# Altium footprint library 6-Connectors-4.PcbLib: 166 footprints (part 8 of 12)
Each footprint in its own frame and in the unit in brackets; x right, y up, seen from the top. Pads: shape width x height; smd on the part's side, far side on the other; paste and mask are expansions set on the pad; w line width, h text height; cw(c..) or ccw(c..) is an arc to the next point about the centre after c.
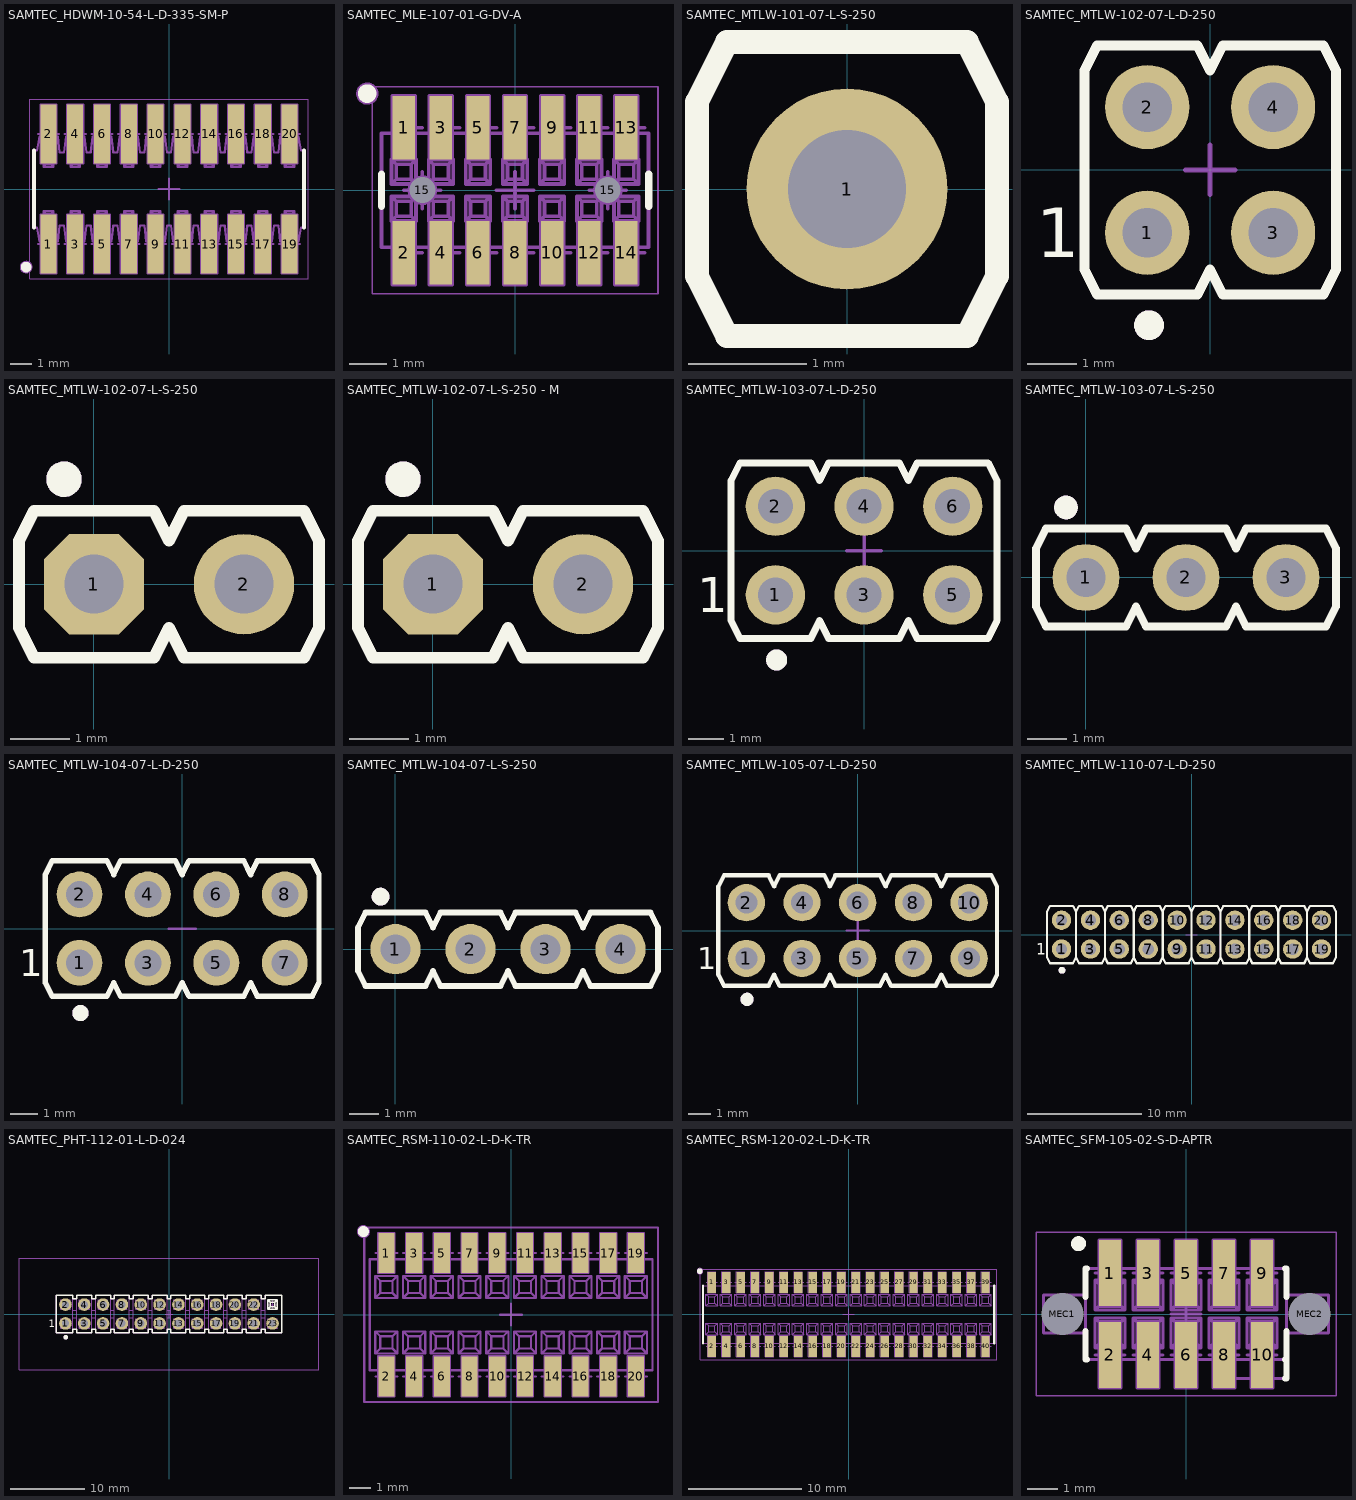
[diagram p7: the footprints below, top view; thin cyan lines are the x and y axes]

## SAMTEC_HDWM-10-54-L-D-335-SM-P [mm] "20 Contacts - Pitch 1.27mm - Dual Row Straight SMD Micro Board Stacker"
height 11.05
pads (20):
  rect 0.76x2.79 smd: 1(-5.715,-2.615) 2(-5.715,2.615) 3(-4.445,-2.615) 4(-4.445,2.615) 5(-3.175,-2.615) 6(-3.175,2.615) 7(-1.905,-2.615) 8(-1.905,2.615) 9(-0.635,-2.615) 10(-0.635,2.615) 11(0.635,-2.615) 12(0.635,2.615) 13(1.905,-2.615) 14(1.905,2.615) 15(3.175,-2.615) 16(3.175,2.615) 17(4.445,-2.615) 18(4.445,2.615) 19(5.715,-2.615) 20(5.715,2.615)
Top Overlay:
  circle w0.25: c-6.775,-3.7 r0.125
  circle w0.25: c-6.775,-3.7 r0.125
  lines w0.2: -6.395,-1.829 -6.395,1.829 ; 6.395,-1.829 6.395,1.829
Mechanical 8:
  drawing of 164 lines, arcs and shapes, not listed
Mechanical 14:
  drawing of 343 lines, arcs and shapes, not listed
Mechanical 15:
  lines w0.05: -6.6,-4.26 -6.6,4.26 6.6,4.26 6.6,-4.26 -6.6,-4.26
3D body "p279-076.stp": height 0.02, standoff 0, extent 5.335,1.22 6.095,4.01
3D body "p279-076.stp": height 0.02, standoff 0, extent 5.335,-4.01 6.095,-1.22
3D body "p279-076.stp": height 0.02, standoff 0, extent 4.065,1.22 4.825,4.01
3D body "p279-076.stp": height 0.02, standoff 0, extent 4.065,-4.01 4.825,-1.22
3D body "p279-076.stp": height 0.02, standoff 0, extent 2.795,1.22 3.555,4.01
3D body "p279-076.stp": height 0.02, standoff 0, extent 2.795,-4.01 3.555,-1.22
3D body "p279-076.stp": height 0.02, standoff 0, extent 1.525,-4.01 2.285,-1.22
3D body "p279-076.stp": height 0.02, standoff 0, extent 1.525,1.22 2.285,4.01
3D body "p279-076.stp": height 0.02, standoff 0, extent 0.255,1.22 1.015,4.01
3D body "p279-076.stp": height 0.02, standoff 0, extent 0.255,-4.01 1.015,-1.22
3D body "p279-076.stp": height 0.02, standoff 0, extent -1.015,-4.01 -0.255,-1.22
3D body "p279-076.stp": height 0.02, standoff 0, extent -1.015,1.22 -0.255,4.01
3D body "p279-076.stp": height 0.02, standoff 0, extent -2.285,1.22 -1.525,4.01
3D body "p279-076.stp": height 0.02, standoff 0, extent -2.285,-4.01 -1.525,-1.22
3D body "p279-076.stp": height 0.02, standoff 0, extent -3.555,-4.01 -2.795,-1.22
3D body "p279-076.stp": height 0.02, standoff 0, extent -3.555,1.22 -2.795,4.01
3D body "p279-076.stp": height 0.02, standoff 0, extent -4.825,1.22 -4.065,4.01
3D body "p279-076.stp": height 0.02, standoff 0, extent -4.825,-4.01 -4.065,-1.22
3D body "p279-076.stp": height 0.02, standoff 0, extent -6.095,-4.01 -5.335,-1.22
3D body "p279-076.stp": height 0.02, standoff 0, extent -6.095,1.22 -5.335,4.01
3D body "SAMTEC_HDWM-10-54-L-D-335-SM-P.stp": height 11.05, standoff 0, extent -6.35,-3.759 6.35,3.759

## SAMTEC_MLE-107-01-G-DV-A [mm] "12 Contacts - Pitch 1mm - Top Entry, Dual Row Surface Mount Receptacle"
height 3.5
pads (16):
  rect 0.61x1.709 smd: 1(-3,1.686) 2(-3,-1.686) 3(-2,1.686) 4(-2,-1.686) 5(-1,1.686) 6(-1,-1.686) 7(0,1.686) 8(0,-1.686) 9(1,1.686) 10(1,-1.686) 11(2,1.686) 12(2,-1.686) 13(3,1.686) 14(3,-1.686)
  round 0.5 hole 0.7 unplated mask+0.1: 15(-2.5,0) 15(2.5,0)
Top Overlay:
  circle w0.25: c-3.987,2.606 r0.125
  circle w0.25: c-3.987,2.606 r0.125
  lines w0.2: -3.6,-0.431 -3.6,0.431 ; 3.6,-0.431 3.6,0.431
Mechanical 8:
  circle w0.1: c2.5,0 r0.35
  circle w0.1: c-2.5,0 r0.35
  lines w0.1: -3,-1.186 -3,-1.686 -2.5,-1.686 ; -3,0 -2.5,0 ; -3,2.186 -3,1.686 -2.5,1.686 ; -2.5,-0.5 -2.5,0 ; -2.5,0.5 -2.5,0 ; -2,-1.186 -2,-1.686 -1.5,-1.686 ; -2,0 -2.5,0 ; -2,2.186 -2,1.686 -1.5,1.686 ; -1,-1.186 -1,-1.686 -0.5,-1.686 ; -1,2.186 -1,1.686 -0.5,1.686 ; -0.5,0 0,0 ; 0,-1.186 0,-1.686 0.5,-1.686 ; 0,-0.5 0,0 ; 0,0.5 0,0 ; 0,2.186 0,1.686 0.5,1.686 ; 0.5,0 0,0 ; 1,-1.186 1,-1.686 1.5,-1.686 ; 1,2.186 1,1.686 1.5,1.686 ; 2,-1.186 2,-1.686 2.5,-1.686 ; 2,0 2.5,0 ; 2,2.186 2,1.686 2.5,1.686 ; 2.5,-0.5 2.5,0 ; 2.5,0.5 2.5,0 ; 3,-1.186 3,-1.686 3.5,-1.686 ; 3,0 2.5,0 ; 3,2.186 3,1.686 3.5,1.686 ; -3.305,-2.54 -2.695,-2.54 -2.695,-0.831 -3.305,-0.831 -3.305,-2.54 ; -3.305,0.831 -2.695,0.831 -2.695,2.54 -3.305,2.54 -3.305,0.831 ; -2.305,-2.54 -1.695,-2.54 -1.695,-0.831 -2.305,-0.831 -2.305,-2.54 ; -2.305,0.831 -1.695,0.831 -1.695,2.54 -2.305,2.54 -2.305,0.831 ; -1.305,-2.54 -0.695,-2.54 -0.695,-0.831 -1.305,-0.831 -1.305,-2.54 ; -1.305,0.831 -0.695,0.831 -0.695,2.54 -1.305,2.54 -1.305,0.831 ; -0.305,-2.54 0.305,-2.54 0.305,-0.831 -0.305,-0.831 -0.305,-2.54 ; -0.305,0.831 0.305,0.831 0.305,2.54 -0.305,2.54 -0.305,0.831 ; 0.695,-2.54 1.305,-2.54 1.305,-0.831 0.695,-0.831 0.695,-2.54 ; 0.695,0.831 1.305,0.831 1.305,2.54 0.695,2.54 0.695,0.831 ; 1.695,-2.54 2.305,-2.54 2.305,-0.831 1.695,-0.831 1.695,-2.54 ; 1.695,0.831 2.305,0.831 2.305,2.54 1.695,2.54 1.695,0.831 ; 2.695,-2.54 3.305,-2.54 3.305,-0.831 2.695,-0.831 2.695,-2.54 ; 2.695,0.831 3.305,0.831 3.305,2.54 2.695,2.54 2.695,0.831
Mechanical 14:
  drawing of 215 lines, arcs and shapes, not listed
Mechanical 15:
  lines w0.05: -3.85,-2.79 3.85,-2.79 3.85,2.79 -3.85,2.79 -3.85,-2.79
3D body "p171-061.stp": height 0.02, standoff 0, extent 2.695,-2.54 3.305,-0.83
3D body "p171-061.stp": height 0.02, standoff 0, extent 2.695,0.831 3.305,2.541
3D body "p171-061.stp": height 0.02, standoff 0, extent 1.695,-2.54 2.305,-0.83
3D body "p171-061.stp": height 0.02, standoff 0, extent 1.695,0.831 2.305,2.541
3D body "p171-061.stp": height 0.02, standoff 0, extent 0.695,-2.54 1.305,-0.83
3D body "p171-061.stp": height 0.02, standoff 0, extent 0.695,0.831 1.305,2.541
3D body "p171-061.stp": height 0.02, standoff 0, extent -0.305,-2.54 0.305,-0.83
3D body "p171-061.stp": height 0.02, standoff 0, extent -0.305,0.831 0.305,2.541
3D body "p171-061.stp": height 0.02, standoff 0, extent -1.305,-2.54 -0.695,-0.83
3D body "p171-061.stp": height 0.02, standoff 0, extent -1.305,0.831 -0.695,2.541
3D body "p171-061.stp": height 0.02, standoff 0, extent -2.305,-2.54 -1.695,-0.83
3D body "p171-061.stp": height 0.02, standoff 0, extent -2.305,0.831 -1.695,2.541
3D body "p171-061.stp": height 0.02, standoff 0, extent -3.305,-2.54 -2.695,-0.83
3D body "p171-061.stp": height 0.02, standoff 0, extent -3.305,0.831 -2.695,2.541
3D body "SAMTEC_MLE-107-01-G-DV-A.stp": height 3.3, standoff -0.71, extent -3.6,-2.159 3.6,2.159

## SAMTEC_MTLW-101-07-L-S-250 [mm] "1 Contacts - Pitch 2.54mm - Single Row Through Mount Straight Header (Post Lead = 6.35mm, Tail Lead 3.05mm, Insulator 1.52mm)"
height 7.87
pads (1):
  round 1.7 hole 1: 1(0,0)
Top Overlay:
  lines w0.2: -1.27,-0.737 -1.016,-1.245 1.016,-1.245 1.27,-0.737 1.27,0.737 1.016,1.245 -1.016,1.245 -1.27,0.737 -1.27,-0.737
Mechanical 8:
  lines w0.1: -0.5,0 0,0 ; 0,-0.5 0,0 ; 0,0.5 0,0 ; 0.5,0 0,0
Mechanical 14:
  lines w0.1: -1.27,-0.737 -1.016,-1.245 1.016,-1.245 1.27,-0.737 1.27,0.737 1.016,1.245 -1.016,1.245 -1.27,0.737 -1.27,-0.737 ; -0.318,-0.318 0.318,-0.318 0.318,0.318 -0.318,0.318 -0.318,-0.318
3D body "SAMTEC_MTLW-101-07-L-S-250.stp": height 7.87, standoff -3.05, extent -1.27,-1.245 1.27,1.245

## SAMTEC_MTLW-102-07-L-D-250 [mm] "4 Contacts - Pitch 2.54mm - Dual Row Through Mount Straight Header (Post Lead = 6.35mm, Tail Lead 3.05mm, Insulator 1.52mm)"
height 7.87
pads (4):
  round 1.7 hole 1: 1(-1.27,-1.27) 2(-1.27,1.27) 3(1.27,-1.27) 4(1.27,1.27)
Top Overlay:
  circle w0.3: c-1.235,-3.135 r0.15
  lines w0.2: 2.54,-2.007 2.54,2.007 ; 2.54,-2.007 2.54,2.007 ; 2.54,-2.007 2.286,-2.515 0.254,-2.515 0,-2.007 -0.254,-2.515 -2.286,-2.515 -2.54,-2.007 -2.54,2.007 -2.286,2.515 -0.254,2.515 0,2.007 0.254,2.515 2.286,2.515 2.54,2.007
  text "1" at -3.517,-1.768 h1
Mechanical 8:
  lines w0.1: -1.77,-1.27 -1.27,-1.27 ; -1.77,1.27 -1.27,1.27 ; -1.27,-1.77 -1.27,-1.27 ; -1.27,-0.77 -1.27,-1.27 ; -1.27,0.77 -1.27,1.27 ; -1.27,1.77 -1.27,1.27 ; -0.77,-1.27 -1.27,-1.27 ; -0.77,1.27 -1.27,1.27 ; -0.5,0 0,0 ; 0,-0.5 0,0 ; 0,0.5 0,0 ; 0.5,0 0,0 ; 0.77,-1.27 1.27,-1.27 ; 0.77,1.27 1.27,1.27 ; 1.27,-1.77 1.27,-1.27 ; 1.27,-0.77 1.27,-1.27 ; 1.27,0.77 1.27,1.27 ; 1.27,1.77 1.27,1.27 ; 1.77,-1.27 1.27,-1.27 ; 1.77,1.27 1.27,1.27
Mechanical 14:
  circle w0.3: c-1.235,-3.135 r0.15
  lines w0.1: 2.54,-2.007 2.54,2.007 ; 2.54,-2.007 2.54,2.007 ; 2.54,-2.007 2.286,-2.515 0.254,-2.515 0,-2.007 -0.254,-2.515 -2.286,-2.515 -2.54,-2.007 -2.54,2.007 -2.286,2.515 -0.254,2.515 0,2.007 0.254,2.515 2.286,2.515 2.54,2.007 ; -1.587,-1.587 -0.953,-1.587 -0.953,-0.953 -1.587,-0.953 -1.587,-1.587 ; -1.587,0.953 -0.953,0.953 -0.953,1.587 -1.587,1.587 -1.587,0.953 ; 0.953,-1.587 1.587,-1.587 1.587,-0.953 0.953,-0.953 0.953,-1.587 ; 0.953,0.953 1.587,0.953 1.587,1.587 0.953,1.587 0.953,0.953
  text "1" at -3.517,-1.768 h1
3D body "SAMTEC_MTLW-102-07-L-D-250.stp": height 7.87, standoff -3.05, extent -2.54,-2.515 2.54,2.515

## SAMTEC_MTLW-102-07-L-S-250 [mm] "2 Contacts - Pitch 2.54mm - Single Row Through Mount Straight Header (Post Lead = 6.35mm, Tail Lead 3.05mm, Insulator 1.52mm)"
height 7.87
pads (2):
  oct 1.7x1.7 hole 1: 1(0,0)
  round 1.7 hole 1: 2(2.54,0)
Top Overlay:
  circle w0.3: c-0.508,1.778 r0.15
  lines w0.2: -1.27,-0.737 -1.27,0.737 -1.016,1.245 1.016,1.245 1.27,0.737 1.524,1.245 3.556,1.245 3.81,0.737 3.81,-0.737 3.556,-1.245 1.524,-1.245 1.27,-0.737 1.016,-1.245 -1.016,-1.245 -1.27,-0.737
Mechanical 8:
  lines w0.1: -0.5,0 0,0 ; 0,-0.5 0,0 ; 0,0.5 0,0 ; 0.5,0 0,0 ; 2.04,0 2.54,0 ; 2.54,-0.5 2.54,0 ; 2.54,0.5 2.54,0 ; 3.04,0 2.54,0
Mechanical 14:
  circle w0.3: c-0.508,1.778 r0.15
  lines w0.1: -1.27,-0.737 -1.27,0.737 -1.016,1.245 1.016,1.245 1.27,0.737 1.524,1.245 3.556,1.245 3.81,0.737 3.81,-0.737 3.556,-1.245 1.524,-1.245 1.27,-0.737 1.016,-1.245 -1.016,-1.245 -1.27,-0.737 ; -0.317,-0.318 -0.317,0.318 0.318,0.318 0.318,-0.318 -0.317,-0.318 ; 2.223,-0.318 2.223,0.318 2.858,0.318 2.858,-0.318 2.223,-0.318
3D body "m20-254via.stp": height 0.1, standoff -1.82, extent 1.69,-0.85 3.39,0.85
3D body "m20-254via.stp": height 0.1, standoff -1.82, extent -0.85,-0.85 0.85,0.85
3D body "SAMTEC_MTLW-102-07-L-S-250.stp": height 7.87, standoff -3.05, extent -1.27,-1.244 3.81,1.245

## SAMTEC_MTLW-102-07-L-S-250 - M [mm] "2 Contacts - Pitch 2.54mm - Single Row Through Mount Straight Header (Post Lead = 6.35mm, Tail Lead 3.05mm, Insulator 1.52mm)"
height 7.87
pads (2):
  oct 1.7x1.7 hole 1: 1(0,0)
  round 1.7 hole 1: 2(2.54,0)
Top Overlay:
  circle w0.3: c-0.508,1.778 r0.15
  lines w0.2: -1.27,-0.737 -1.016,-1.245 1.016,-1.245 1.27,-0.737 1.524,-1.245 3.556,-1.245 3.81,-0.737 3.81,0.737 3.556,1.245 1.524,1.245 1.27,0.737 1.016,1.245 -1.016,1.245 -1.27,0.737 -1.27,-0.737
Mechanical 8:
  lines w0.1: -0.5,0 0,0 ; 0,-0.5 0,0 ; 0,0.5 0,0 ; 0.5,0 0,0 ; 2.04,0 2.54,0 ; 2.54,-0.5 2.54,0 ; 2.54,0.5 2.54,0 ; 3.04,0 2.54,0
Mechanical 14:
  circle w0.3: c-0.508,1.778 r0.15
  lines w0.1: -1.27,-0.737 -1.016,-1.245 1.016,-1.245 1.27,-0.737 1.524,-1.245 3.556,-1.245 3.81,-0.737 3.81,0.737 3.556,1.245 1.524,1.245 1.27,0.737 1.016,1.245 -1.016,1.245 -1.27,0.737 -1.27,-0.737 ; -0.317,-0.318 0.318,-0.318 0.318,0.318 -0.317,0.318 -0.317,-0.318 ; 2.223,-0.318 2.858,-0.318 2.858,0.318 2.223,0.318 2.223,-0.318
3D body "254-jp.stp": height 7, standoff 1, extent -1.22,-1.225 3.76,1.225
3D body "SAMTEC_MTLW-102-07-L-S-250.stp": height 6.87, standoff -4.05, extent -1.27,-1.244 3.81,1.245
3D body "m20-254via.stp": height 0.1, standoff -1.82, extent -0.85,-0.85 0.85,0.85
3D body "m20-254via.stp": height 0.1, standoff -1.82, extent 1.69,-0.85 3.39,0.85

## SAMTEC_MTLW-103-07-L-D-250 [mm] "6 Contacts - Pitch 2.54mm - Dual Row Through Mount Straight Header (Post Lead = 6.35mm, Tail Lead 3.05mm, Insulator 1.52mm)"
height 7.87
pads (6):
  round 1.7 hole 1: 1(-2.54,-1.27) 2(-2.54,1.27) 3(0,-1.27) 4(0,1.27) 5(2.54,-1.27) 6(2.54,1.27)
Top Overlay:
  circle w0.3: c-2.505,-3.135 r0.15
  lines w0.2: 3.81,-2.007 3.81,2.007 ; 3.81,-2.007 3.556,-2.515 1.524,-2.515 1.27,-2.007 1.016,-2.515 -1.016,-2.515 -1.27,-2.007 -1.524,-2.515 -3.556,-2.515 -3.81,-2.007 -3.81,2.007 -3.556,2.515 -1.524,2.515 -1.27,2.007 -1.016,2.515 1.016,2.515 1.27,2.007 1.524,2.515 3.556,2.515 3.81,2.007 ; 3.81,-2.007 3.81,2.007
  text "1" at -4.787,-1.768 h1
Mechanical 8:
  lines w0.1: -3.04,-1.27 -2.54,-1.27 ; -3.04,1.27 -2.54,1.27 ; -2.54,-1.77 -2.54,-1.27 ; -2.54,-0.77 -2.54,-1.27 ; -2.54,0.77 -2.54,1.27 ; -2.54,1.77 -2.54,1.27 ; -2.04,-1.27 -2.54,-1.27 ; -2.04,1.27 -2.54,1.27 ; -0.5,-1.27 0,-1.27 ; -0.5,0 0,0 ; -0.5,1.27 0,1.27 ; 0,-1.77 0,-1.27 ; 0,-0.77 0,-1.27 ; 0,-0.5 0,0 ; 0,0.5 0,0 ; 0,0.77 0,1.27 ; 0,1.77 0,1.27 ; 0.5,-1.27 0,-1.27 ; 0.5,0 0,0 ; 0.5,1.27 0,1.27 ; 2.04,-1.27 2.54,-1.27 ; 2.04,1.27 2.54,1.27 ; 2.54,-1.77 2.54,-1.27 ; 2.54,-0.77 2.54,-1.27 ; 2.54,0.77 2.54,1.27 ; 2.54,1.77 2.54,1.27 ; 3.04,-1.27 2.54,-1.27 ; 3.04,1.27 2.54,1.27
Mechanical 14:
  circle w0.3: c-2.505,-3.135 r0.15
  lines w0.1: 3.81,-2.007 3.81,2.007 ; 3.81,-2.007 3.556,-2.515 1.524,-2.515 1.27,-2.007 1.016,-2.515 -1.016,-2.515 -1.27,-2.007 -1.524,-2.515 -3.556,-2.515 -3.81,-2.007 -3.81,2.007 -3.556,2.515 -1.524,2.515 -1.27,2.007 -1.016,2.515 1.016,2.515 1.27,2.007 1.524,2.515 3.556,2.515 3.81,2.007 ; 3.81,-2.007 3.81,2.007 ; -2.858,-1.587 -2.222,-1.587 -2.222,-0.953 -2.858,-0.953 -2.858,-1.587 ; -2.858,0.953 -2.222,0.953 -2.222,1.587 -2.858,1.587 -2.858,0.953 ; -0.318,-1.587 0.318,-1.587 0.318,-0.953 -0.318,-0.953 -0.318,-1.587 ; -0.318,0.953 0.318,0.953 0.318,1.587 -0.318,1.587 -0.318,0.953 ; 2.222,-1.587 2.858,-1.587 2.858,-0.953 2.222,-0.953 2.222,-1.587 ; 2.222,0.953 2.858,0.953 2.858,1.587 2.222,1.587 2.222,0.953
  text "1" at -4.787,-1.768 h1
3D body "SAMTEC_MTLW-103-07-L-D-250.stp": height 7.87, standoff -3.05, extent -3.81,-2.514 3.81,2.515

## SAMTEC_MTLW-103-07-L-S-250 [mm] "3 Contacts - Pitch 2.54mm - Single Row Through Mount Straight Header (Post Lead = 6.35mm, Tail Lead 3.05mm, Insulator 1.52mm)"
height 7.87
pads (3):
  round 1.7 hole 1: 1(0,0) 2(2.54,0) 3(5.08,0)
Top Overlay:
  circle w0.3: c-0.508,1.778 r0.15
  lines w0.2: -1.27,-0.737 -1.016,-1.245 1.016,-1.245 1.27,-0.737 1.524,-1.245 3.556,-1.245 3.81,-0.737 4.064,-1.245 6.096,-1.245 6.35,-0.737 6.35,0.737 6.096,1.245 4.064,1.245 3.81,0.737 3.556,1.245 1.524,1.245 1.27,0.737 1.016,1.245 -1.016,1.245 -1.27,0.737 -1.27,-0.737
Mechanical 8:
  lines w0.1: -0.5,0 0,0 ; 0,-0.5 0,0 ; 0,0.5 0,0 ; 0.5,0 0,0 ; 2.04,0 2.54,0 ; 2.54,-0.5 2.54,0 ; 2.54,0.5 2.54,0 ; 3.04,0 2.54,0 ; 4.58,0 5.08,0 ; 5.08,-0.5 5.08,0 ; 5.08,0.5 5.08,0 ; 5.58,0 5.08,0
Mechanical 14:
  circle w0.3: c-0.508,1.778 r0.15
  lines w0.1: -1.27,-0.737 -1.016,-1.245 1.016,-1.245 1.27,-0.737 1.524,-1.245 3.556,-1.245 3.81,-0.737 4.064,-1.245 6.096,-1.245 6.35,-0.737 6.35,0.737 6.096,1.245 4.064,1.245 3.81,0.737 3.556,1.245 1.524,1.245 1.27,0.737 1.016,1.245 -1.016,1.245 -1.27,0.737 -1.27,-0.737 ; -0.317,-0.318 0.318,-0.318 0.318,0.318 -0.317,0.318 -0.317,-0.318 ; 2.223,-0.318 2.858,-0.318 2.858,0.318 2.223,0.318 2.223,-0.318 ; 4.763,-0.318 5.398,-0.318 5.398,0.318 4.763,0.318 4.763,-0.318
3D body "SAMTEC_MTLW-103-07-L-S-250.stp": height 7.87, standoff -3.05, extent -1.27,-1.245 6.35,1.245

## SAMTEC_MTLW-104-07-L-D-250 [mm] "8 Contacts - Pitch 2.54mm - Dual Row Through Mount Straight Header (Post Lead = 6.35mm, Tail Lead 3.05mm, Insulator 1.52mm)"
height 7.87
pads (8):
  round 1.7 hole 1: 1(-3.81,-1.27) 2(-3.81,1.27) 3(-1.27,-1.27) 4(-1.27,1.27) 5(1.27,-1.27) 6(1.27,1.27) 7(3.81,-1.27) 8(3.81,1.27)
Top Overlay:
  circle w0.3: c-3.775,-3.135 r0.15
  lines w0.2: 5.08,-2.007 5.08,2.007 ; 5.08,-2.007 4.826,-2.515 2.794,-2.515 2.54,-2.007 2.286,-2.515 0.254,-2.515 0,-2.007 -0.254,-2.515 -2.286,-2.515 -2.54,-2.007 -2.794,-2.515 -4.826,-2.515 -5.08,-2.007 -5.08,2.007 -4.826,2.515 -2.794,2.515 -2.54,2.007 -2.286,2.515 -0.254,2.515 0,2.007 0.254,2.515 2.286,2.515 2.54,2.007 2.794,2.515 4.826,2.515 5.08,2.007 ; 5.08,-2.007 5.08,2.007
  text "1" at -6.057,-1.768 h1
Mechanical 8:
  lines w0.1: -4.31,-1.27 -3.81,-1.27 ; -4.31,1.27 -3.81,1.27 ; -3.81,-1.77 -3.81,-1.27 ; -3.81,-0.77 -3.81,-1.27 ; -3.81,0.77 -3.81,1.27 ; -3.81,1.77 -3.81,1.27 ; -3.31,-1.27 -3.81,-1.27 ; -3.31,1.27 -3.81,1.27 ; -1.77,-1.27 -1.27,-1.27 ; -1.77,1.27 -1.27,1.27 ; -1.27,-1.77 -1.27,-1.27 ; -1.27,-0.77 -1.27,-1.27 ; -1.27,0.77 -1.27,1.27 ; -1.27,1.77 -1.27,1.27 ; -0.77,-1.27 -1.27,-1.27 ; -0.77,1.27 -1.27,1.27 ; -0.5,0 0,0 0.5,0 ; 0.77,-1.27 1.27,-1.27 ; 0.77,1.27 1.27,1.27 ; 1.27,-1.77 1.27,-1.27 ; 1.27,-0.77 1.27,-1.27 ; 1.27,0.77 1.27,1.27 ; 1.27,1.77 1.27,1.27 ; 1.77,-1.27 1.27,-1.27 ; 1.77,1.27 1.27,1.27 ; 3.31,-1.27 3.81,-1.27 ; 3.31,1.27 3.81,1.27 ; 3.81,-1.77 3.81,-1.27 ; 3.81,-0.77 3.81,-1.27 ; 3.81,0.77 3.81,1.27 ; 3.81,1.77 3.81,1.27 ; 4.31,-1.27 3.81,-1.27 ; 4.31,1.27 3.81,1.27
Mechanical 14:
  circle w0.3: c-3.775,-3.135 r0.15
  lines w0.1: 5.08,-2.007 5.08,2.007 ; 5.08,-2.007 4.826,-2.515 2.794,-2.515 2.54,-2.007 2.286,-2.515 0.254,-2.515 0,-2.007 -0.254,-2.515 -2.286,-2.515 -2.54,-2.007 -2.794,-2.515 -4.826,-2.515 -5.08,-2.007 -5.08,2.007 -4.826,2.515 -2.794,2.515 -2.54,2.007 -2.286,2.515 -0.254,2.515 0,2.007 0.254,2.515 2.286,2.515 2.54,2.007 2.794,2.515 4.826,2.515 5.08,2.007 ; 5.08,-2.007 5.08,2.007 ; -4.128,-1.587 -4.128,-0.953 -3.493,-0.953 -3.493,-1.587 -4.128,-1.587 ; -4.128,0.953 -4.128,1.587 -3.493,1.587 -3.493,0.953 -4.128,0.953 ; -1.587,-1.587 -1.587,-0.953 -0.953,-0.953 -0.953,-1.587 -1.587,-1.587 ; -1.587,0.953 -1.587,1.587 -0.953,1.587 -0.953,0.953 -1.587,0.953 ; 0.953,-1.587 0.953,-0.953 1.587,-0.953 1.587,-1.587 0.953,-1.587 ; 0.953,0.953 0.953,1.587 1.587,1.587 1.587,0.953 0.953,0.953 ; 3.493,-1.587 3.493,-0.953 4.128,-0.953 4.128,-1.587 3.493,-1.587 ; 3.493,0.953 3.493,1.587 4.128,1.587 4.128,0.953 3.493,0.953
  text "1" at -6.057,-1.768 h1
3D body "SAMTEC_MTLW-104-07-L-D-250.stp": height 7.87, standoff -3.05, extent -5.08,-2.515 5.08,2.515

## SAMTEC_MTLW-104-07-L-S-250 [mm] "4 Contacts - Pitch 2.54mm - Single Row Through Mount Straight Header (Post Lead = 6.35mm, Tail Lead 3.05mm, Insulator 1.52mm)"
height 7.87
pads (4):
  round 1.7 hole 1: 1(0,0) 2(2.54,0) 3(5.08,0) 4(7.62,0)
Top Overlay:
  circle w0.3: c-0.508,1.778 r0.15
  lines w0.2: -1.27,-0.737 -1.016,-1.245 1.016,-1.245 1.27,-0.737 1.524,-1.245 3.556,-1.245 3.81,-0.737 4.064,-1.245 6.096,-1.245 6.35,-0.737 6.604,-1.245 8.636,-1.245 8.89,-0.737 8.89,0.737 8.636,1.245 6.604,1.245 6.35,0.737 6.096,1.245 4.064,1.245 3.81,0.737 3.556,1.245 1.524,1.245 1.27,0.737 1.016,1.245 -1.016,1.245 -1.27,0.737 -1.27,-0.737
Mechanical 8:
  lines w0.1: -0.5,0 0,0 ; 0,-0.5 0,0 ; 0,0.5 0,0 ; 0.5,0 0,0 ; 2.04,0 2.54,0 ; 2.54,-0.5 2.54,0 ; 2.54,0.5 2.54,0 ; 3.04,0 2.54,0 ; 4.58,0 5.08,0 ; 5.08,-0.5 5.08,0 ; 5.08,0.5 5.08,0 ; 5.58,0 5.08,0 ; 7.12,0 7.62,0 ; 7.62,-0.5 7.62,0 ; 7.62,0.5 7.62,0 ; 8.12,0 7.62,0
Mechanical 14:
  circle w0.3: c-0.508,1.778 r0.15
  lines w0.1: -1.27,-0.737 -1.016,-1.245 1.016,-1.245 1.27,-0.737 1.524,-1.245 3.556,-1.245 3.81,-0.737 4.064,-1.245 6.096,-1.245 6.35,-0.737 6.604,-1.245 8.636,-1.245 8.89,-0.737 8.89,0.737 8.636,1.245 6.604,1.245 6.35,0.737 6.096,1.245 4.064,1.245 3.81,0.737 3.556,1.245 1.524,1.245 1.27,0.737 1.016,1.245 -1.016,1.245 -1.27,0.737 -1.27,-0.737 ; -0.317,-0.318 0.318,-0.318 0.318,0.318 -0.317,0.318 -0.317,-0.318 ; 2.223,-0.318 2.858,-0.318 2.858,0.318 2.223,0.318 2.223,-0.318 ; 4.763,-0.318 5.398,-0.318 5.398,0.318 4.763,0.318 4.763,-0.318 ; 7.303,-0.318 7.938,-0.318 7.938,0.318 7.303,0.318 7.303,-0.318
3D body "m20-254via.stp": height 0.1, standoff -1.82, extent 6.77,-0.85 8.47,0.85
3D body "m20-254via.stp": height 0.1, standoff -1.82, extent 4.23,-0.85 5.93,0.85
3D body "m20-254via.stp": height 0.1, standoff -1.82, extent 1.69,-0.85 3.39,0.85
3D body "m20-254via.stp": height 0.1, standoff -1.82, extent -0.85,-0.85 0.85,0.85
3D body "SAMTEC_MTLW-104-07-L-S-250.stp": height 7.87, standoff -3.05, extent -1.27,-1.244 8.89,1.245
